# Altium footprint library Elettronica FM.PcbLib: 387 footprints (part 25 of 25)
Each footprint in its own frame and in the unit in brackets; x right, y up, seen from the top. Pads: shape width x height; smd on the part's side, far side on the other; paste and mask are expansions set on the pad; w line width, h text height; cw(c..) or ccw(c..) is an arc to the next point about the centre after c.
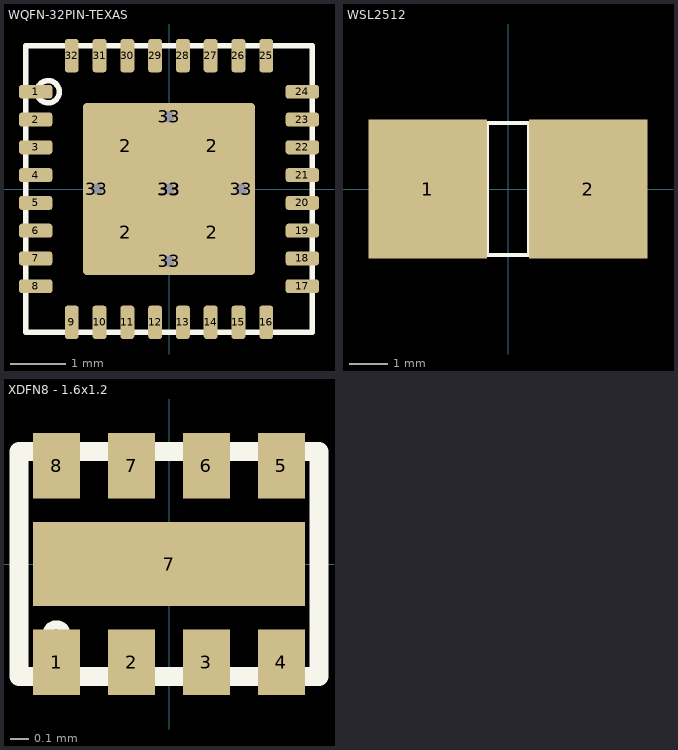
[diagram p24: the footprints below, top view; thin cyan lines are the x and y axes]

## WQFN-32PIN-TEXAS [mm]
height 1.9
pads (42):
  rrect40% 0.6x0.25 smd paste+0 mask+0.07: 1(-2.4,1.75) 2(-2.4,1.25) 3(-2.4,0.75) 4(-2.4,0.25) 5(-2.4,-0.25) 6(-2.4,-0.75) 7(-2.4,-1.25) 8(-2.4,-1.75) 17(2.4,-1.75) 18(2.4,-1.25) 19(2.4,-0.75) 20(2.4,-0.25) 21(2.4,0.25) 22(2.4,0.75) 23(2.4,1.25) 24(2.4,1.75)
  rrect5% 1.35x1.35 on Top Paste mask+0.1: 2(-0.775,-0.775) 2(-0.775,0.775) 2(0.775,-0.775) 2(0.775,0.775)
  rrect40% 0.25x0.6 smd paste+0 mask+0.07: 9(-1.75,-2.4) 10(-1.25,-2.4) 11(-0.75,-2.4) 12(-0.25,-2.4) 13(0.25,-2.4) 14(0.75,-2.4) 15(1.25,-2.4) 16(1.75,-2.4) 25(1.75,2.4) 26(1.25,2.4) 27(0.75,2.4) 28(0.25,2.4) 29(-0.25,2.4) 30(-0.75,2.4) 31(-1.25,2.4) 32(-1.75,2.4)
  round 0.5 hole 0.2 mask+0.075: 33(-1.3,0) 33(0,-1.3) 33(0,0) 33(0,1.3) 33(1.3,0)
  rrect5% 3.1x3.1 smd paste-50 mask+0.07: 33(0,0)
Top Overlay:
  circle w0.1: c-2.175,1.75 r0.2
  lines w0.1: -2.575,-2.575 -2.575,2.575 2.575,2.575 2.575,-2.575 -2.575,-2.575
3D body: height 0.8, standoff 0, extent -2.575,-2.575 2.575,2.575

## WSL2512 [mm]
height 14.2
pads (2):
  rect 3.1x3.65 smd mask+0.075: 1(-2.1,0) 2(2.1,0)
Top Overlay:
  lines w0.1: -0.55,-1.725 -0.55,1.725 ; 0.55,-1.725 0.55,1.725 ; -3.3,-1.725 3.3,-1.725 3.3,1.725 -3.3,1.725 -3.3,-1.725

## XDFN8 - 1.6x1.2 [mm]
height 1.9
pads (9):
  rect 0.25x0.35 smd paste-0.05 mask+0.05: 1(-0.6,-0.525) 2(-0.2,-0.525) 3(0.2,-0.525) 4(0.6,-0.525) 5(0.6,0.525) 6(0.2,0.525) 7(-0.2,0.525) 8(-0.6,0.525)
  rect 1.45x0.45 smd paste-0.05 mask+0.05: 7(0,0)
Top Overlay:
  circle w0.05: c-0.6,-0.375 r0.05
  lines w0.1: -0.8,-0.6 -0.8,0.6 0.8,0.6 0.8,-0.6 -0.8,-0.6
3D body: height 0.45, standoff 0, extent -0.8,-0.6 0.8,0.6